# Altium footprint library PcbLibLafe.PcbLib: 294 footprints (part 6 of 19)
Each footprint in its own frame and in the unit in brackets; x right, y up, seen from the top. Pads: shape width x height; smd on the part's side, far side on the other; paste and mask are expansions set on the pad; w line width, h text height; cw(c..) or ccw(c..) is an arc to the next point about the centre after c.
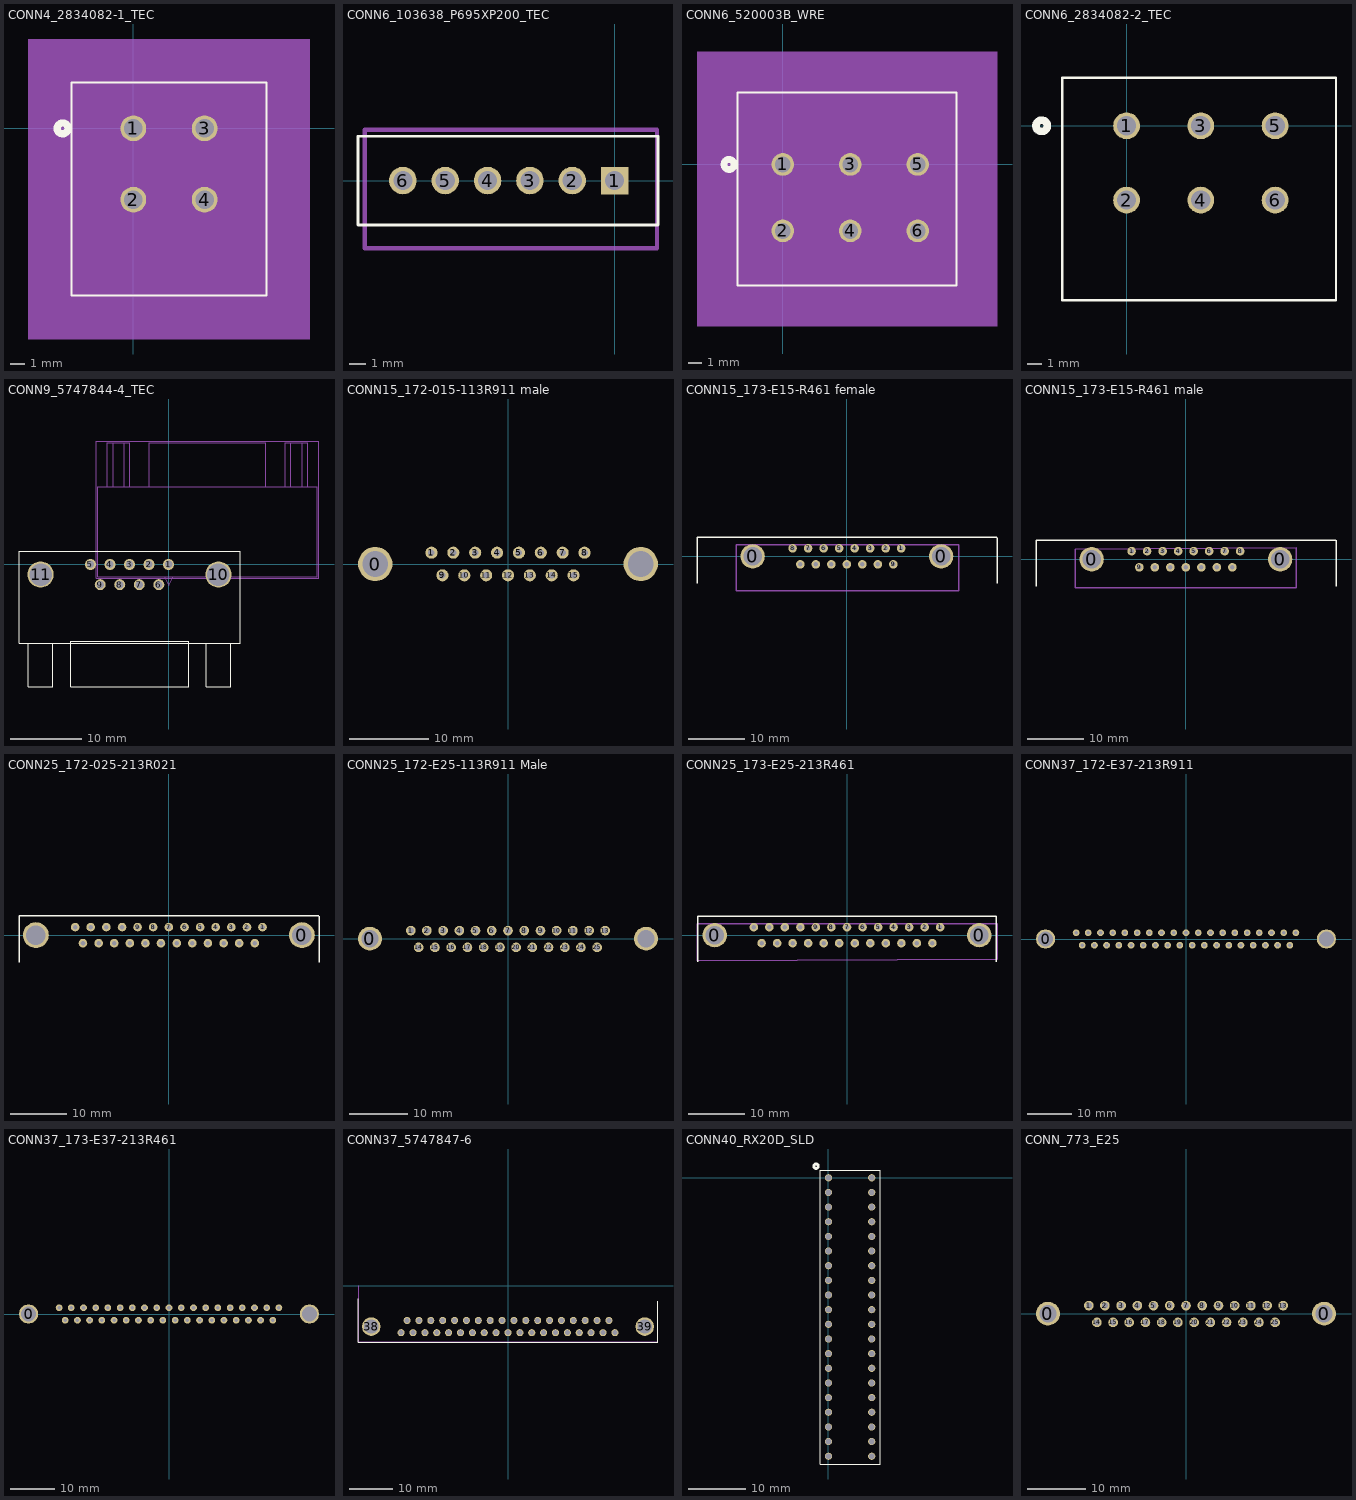
[diagram p5: the footprints below, top view; thin cyan lines are the x and y axes]

## CONN4_2834082-1_TEC [mil]
pads (4):
  round 71 hole 51 mask+0: 1(0,0) 2(0,-196.85) 3(196.85,0) 4(196.85,-196.85)
Top Overlay:
  circle w20: c-195.57,0 r15
  lines w6: -170.57,-461.95 -170.57,127.05 367.43,127.05 367.43,-461.95 -170.57,-461.95
Bottom Overlay:
  circle w20: c-195.57,0 r15
Mechanical 5:
  region: -290.57,247.05 487.43,247.05 487.43,-581.95 -290.57,-581.95
Mechanical 13:
  circle w20: c0,75 r15
  lines w1: -165.57,-456.95 -165.57,122.05 362.43,122.05 362.43,-456.95 -165.57,-456.95
Mechanical 15:
  region: 372.43,132.05 -175.57,132.05 -175.57,-466.95 372.43,-466.95
  lines w6: -175.57,-466.95 372.43,-466.95 372.43,132.05 -175.57,132.05 -175.57,-466.95
3D body "c-2834082-1-a-3d.stp": height 796.26, standoff -157.48, extent -153.94,-440 353.94,117.1
3D body: height 10, standoff 0, extent 0,0 10,10

## CONN6_103638_P695XP200_TEC [mil]
pads (6):
  rect 65x65 hole 45 mask+0: 1(0,0)
  round 65 hole 45 mask+0: 2(-100,0) 3(-200,0) 4(-300,0) 5(-400,0) 6(-500,0)
Top Overlay:
  lines w6: -606,-105 -606,105 102.5,105 102.5,-105 -606,-105
Mechanical 7:
Mechanical 40:
  lines w10: -590,-160 -590,120 100,120 100,-160 -590,-160
3D body: height 10, standoff 0, extent 0,0 10,10
3D body "c-103638-5-s-3d.stp": height 495, standoff -169.96, extent -594.44,-157 100.44,118

## CONN6_520003B_WRE [mil]
pads (6):
  round 67 hole 47 mask+0: 1(0,0) 2(0,-196.85) 3(200,0) 4(200,-196.85) 5(400,0) 6(400,-196.85)
Top Overlay:
  circle w20: c-159.32,0 r15
  lines w6: -134.32,-359.33 -134.32,213.67 515.05,213.67 515.05,-359.33 -134.32,-359.33
Bottom Overlay:
  circle w20: c-159.32,0 r15
Mechanical 5:
  region: -254.32,333.67 635.05,333.67 635.05,-479.33 -254.32,-479.33
Mechanical 13:
  circle w20: c0,75 r15
  lines w1: -129.32,-354.33 -129.32,208.67 510.05,208.67 510.05,-354.33 -129.32,-354.33
Mechanical 15:
  region: 520.05,218.67 -139.32,218.67 -139.32,-364.33 520.05,-364.33
  lines w6: -139.32,-364.33 520.05,-364.33 520.05,218.67 -139.32,218.67 -139.32,-364.33
3D body: height 10, standoff 0, extent 0,0 10,10
3D body "Download_STP_691408520003B_rev1.stp": height 531.5, standoff -168.74, extent -159.06,-351.18 527.56,200

## CONN6_2834082-2_TEC [mil]
pads (6):
  round 71 hole 51 mask+0: 1(0,0) 2(0,-196.85) 3(196.85,0) 4(196.85,-196.85) 5(393.7,0) 6(393.7,-196.85)
Top Overlay:
  circle w20: c-225,0 r15
  lines w6: -170.57,-461.95 -170.57,127.05 555,127.05 555,-461.95 -170.57,-461.95
3D body "2834082-2--3DModel-STEP-1.STEP": height 796.26, standoff -157.48, extent -157.36,-442.58 547.36,114.53
3D body: height 10, standoff 0, extent 0,0 10,10

## CONN9_5747844-4_TEC [mil]
pads (11):
  round 61 hole 41 mask+0: 1(0,0) 2(-108,0) 3(-216,0) 4(-324,0) 5(-432,0) 6(-54,-112) 7(-162,-112) 8(-270,-112) 9(-378,-112)
  round 145 hole 125: 10(276,-56) 11(-708,-56)
Top Overlay:
  lines w6: -775.5,-435 -775.5,-678 -640.5,-678 -640.5,-435 ; 208.5,-435 208.5,-678 343.5,-678 343.5,-435 ; -827.5,-435 -827.5,72 395.5,72 395.5,-435 -827.5,-435 ; -542.5,-678 -542.5,-425 110.5,-425 110.5,-678 -542.5,-678
Mechanical 13:
  lines w1: -338.5,430 -338.5,673 -213.5,673 -213.5,430 ; -307.25,430 -307.25,673 ; -244.75,430 -244.75,673 ; -25,-67 0,-117 25,-67 ; 645.5,430 645.5,673 770.5,673 770.5,430 ; 676.75,430 676.75,673 ; 739.25,430 739.25,673 ; -390.5,-67 822.5,-67 822.5,430 -390.5,430 -390.5,-67 ; -105.5,430 537.5,430 537.5,673 -105.5,673 -105.5,430
Mechanical 15:
  lines w6: -400.5,-77 -400.5,683 832.5,683 832.5,-77 -400.5,-77
3D body "c-5747844-04-o-3d.stp": height 497, standoff -125.4, extent -823,-679.9 397,64

## CONN15_172-015-113R911 male [mil] "15-pin Dsub male straight"
pads (17):
  round 170 hole 128: 0(-656,0)
  round 60 hole 32: 1(-378,56) 2(-270,56) 3(-162,56) 4(-54,56) 5(54,56) 6(162,56) 7(270,56) 8(378,56) 9(-324,-56) 10(-216,-56) 11(-108,-56) 12(0,-56) 13(108,-56) 14(216,-56) 15(324,-56)
  round 170 hole 128 unplated: ""(656,0)
3D body "172-015-112.STEP": height 495.91, standoff -187.59, extent -776.5,-245 766.5,251

## CONN15_173-E15-R461 female [mil] "15-pin Dsub Female right angle"
pads (17):
  round 170 hole 128: 0(-656,0)
  round 170 hole 128 unplated: 0(656,0)
  round 60 hole 32: 1(378,56) 2(270,56) 3(162,56) 4(54,56) 5(-54,56) 6(-162,56) 7(-270,56) 8(-378,56) 9(324,-56) 10(216,-56) 11(108,-56) 12(0,-56) 13(-108,-56) 14(-216,-56) 15(-324,-56)
Top Overlay:
  lines w10: -1043.31,-188 -1043.31,133.86 1043.31,133.86 ; 1045.28,-188 1045.28,131.1
Mechanical 40:
  lines w10: -770,-240 780,-240 780,80 -770,80 -770,-240
3D body "173-E15-213R001.STEP": height 346.06, standoff -268.11, extent -766.65,-602.54 776.66,76.2

## CONN15_173-E15-R461 male [mil] "15-pin Dsub male right angle"
pads (17):
  round 170 hole 128: 0(-656,0)
  round 170 hole 128 unplated: 0(656,0)
  round 60 hole 32: 1(-378,56) 2(-270,56) 3(-162,56) 4(-54,56) 5(54,56) 6(162,56) 7(270,56) 8(378,56) 9(-324,-56) 10(-216,-56) 11(-108,-56) 12(0,-56) 13(108,-56) 14(216,-56) 15(324,-56)
Top Overlay:
  lines w10: -1043.31,-188 -1043.31,133.86 1043.31,133.86 ; 1045.28,-188 1045.28,131.1
Mechanical 40:
  lines w10: -770,-200 770,-200 770,80 -770,70 -770,-200
3D body "173-E15-113R001.step.STEP": height 396.06, standoff -214.17, extent -771.65,-612.32 771.66,72.32

## CONN25_172-025-213R021 [mil] "25-pin Dsub Female straight"
pads (27):
  round 180 hole 135 unplated: 0(926,0)
  round 60 hole 32: 1(652,56) 2(544,56) 3(435,56) 4(326,56) 5(218,56) 6(109,56) 7(0,56) 8(-109,56) 9(-218,56) 10(-326,56) 11(-435,56) 12(-544,56) 13(-652,56) 14(598,-56) 15(489,-56) 16(381,-56) 17(272,-56) 18(163,-56) 19(55,-56) 20(-55,-56) 21(-163,-56) 22(-272,-56) 23(-381,-56) 24(-489,-56) 25(-598,-56)
  round 180 hole 135: ""(-926,0)
Top Overlay:
  lines w10: -1043.31,-188 -1043.31,133.86 1043.31,133.86 ; 1045.28,-188 1045.28,131.1
3D body "172-E25-213.STEP": height 497, standoff -188.5, extent -1042,-245 1045,251

## CONN25_172-E25-113R911 Male [mil] "25 pin maie straight"
pads (27):
  round 160 hole 115: 0(-926,0) ""(926,0)
  round 65 hole 40: 1(-652,54) 2(-544,54) 3(-435,54) 4(-326,54) 5(-218,54) 6(-109,54) 7(0,54) 8(109,54) 9(218,54) 10(326,54) 11(435,54) 12(544,54) 13(652,54) 14(-599,-58) 15(-490,-58) 16(-381,-58) 17(-272,-58) 18(-163,-58) 19(-54,-58) 20(55,-58) 21(163,-58) 22(272,-58) 23(381,-58) 24(489,-58) 25(598,-58)
3D body "172-025-112.STEP": height 490, standoff -193.5, extent -1048.5,-245 1038.5,251

## CONN25_173-E25-213R461 [mil] "25-pin Dsub Female right angle"
pads (27):
  round 170 hole 128: 0(-926,0)
  round 170 hole 128 unplated: 0(926,0)
  round 60 hole 32: 1(652,56) 2(544,56) 3(435,56) 4(326,56) 5(218,56) 6(109,56) 7(0,56) 8(-109,56) 9(-218,56) 10(-326,56) 11(-435,56) 12(-544,56) 13(-652,56) 14(598,-56) 15(489,-56) 16(381,-56) 17(272,-56) 18(163,-56) 19(55,-56) 20(-55,-56) 21(-163,-56) 22(-272,-56) 23(-381,-56) 24(-489,-56) 25(-598,-56)
Top Overlay:
  lines w10: -1043.31,-188 -1043.31,133.86 1043.31,133.86 ; 1045.28,-188 1045.28,131.1
Mechanical 40:
  lines w10: -1050,-180 1050,-170 1050,80 -1050,80 -1050,-180
3D body "173-E25-213R001.STEP": height 446.06, standoff -168.11, extent -1044.58,-607.37 1044,71.37

## CONN37_172-E37-213R911 [mil] "Female 37pin dsub"
pads (39):
  round 170 hole 130: 0(-1250,0) ""(1250,0)
  round 60 hole 32 mask+0: 1(978,56) 2(870,56) 3(761,56) 4(652,56) 5(544,56) 6(435,56) 7(326,56) 8(218,56) 9(109,56) 10(0,56) 11(-109,56) 12(-218,56) 13(-326,56) 14(-435,56) 15(-544,56) 16(-652,56) 17(-761,56) 18(-871,56) 19(-978,56) 20(924,-56) 21(815,-56) 22(707,-56) 23(598,-56) 24(489,-56) 25(381,-56) 26(272,-56) 27(163,-56) 28(55,-56) 29(-55,-56) 30(-163,-56) 31(-272,-56) 32(-381,-56) 33(-489,-56) 34(-598,-56) 35(-707,-56) 36(-815,-56) 37(-924,-56)
3D body "172-E37-213.STEP": height 478.22, standoff -207.28, extent -1359,-219 1369,277

## CONN37_173-E37-213R461 [mil] "Female 37pin dsub"
pads (39):
  round 170 hole 130: 0(-1250,0) ""(1250,0)
  round 60 hole 32: 1(978,56) 2(870,56) 3(761,56) 4(652,56) 5(544,56) 6(435,56) 7(326,56) 8(218,56) 9(109,56) 10(0,56) 11(-109,56) 12(-218,56) 13(-326,56) 14(-435,56) 15(-544,56) 16(-652,56) 17(-761,56) 18(-871,56) 19(-978,56) 20(924,-56) 21(815,-56) 22(707,-56) 23(598,-56) 24(489,-56) 25(381,-56) 26(272,-56) 27(163,-56) 28(55,-56) 29(-55,-56) 30(-163,-56) 31(-272,-56) 32(-381,-56) 33(-489,-56) 34(-598,-56) 35(-707,-56) 36(-815,-56) 37(-924,-56)
Mechanical 1:
  text "Consult datasheet for placement" at -816,-30.01 h60
3D body "174E-037-213.STEP": height 446, standoff -209.5, extent -1367,-698 1361,73.96

## CONN37_5747847-6 [mil] "male 37pin dsub"
pads (39):
  round 65 hole 45 mask+0: 1(-981,-430) 2(-872,-430) 3(-763,-430) 4(-654,-430) 5(-545,-430) 6(-436,-430) 7(-327,-430) 8(-218,-430) 9(-109,-430) 10(0,-430) 11(109,-430) 12(218,-430) 13(327,-430) 14(436,-430) 15(545,-430) 16(654,-430) 17(763,-430) 18(872,-430) 19(981,-430) 20(-926.5,-318) 21(-817.5,-318) 22(-708.5,-318) 23(-599.5,-318) 24(-490.5,-318) 25(-381.5,-318) 26(-272.5,-318) 27(-163.5,-318) 28(-54.5,-318) 29(54.5,-318) 30(163.5,-318) 31(272.5,-318) 32(381.5,-318) 33(490.5,-318) 34(599.5,-318) 35(708.5,-318) 36(817.5,-318) 37(926.5,-318)
  round 170 hole 130: 38(-1255,-374)
  round 170 / inner round 130 / far side round 130 hole 130: 39(1255,-374)
Top Overlay:
  lines w6: -1377,-118 -1377,-517 1377,-517 1377,-141
Mechanical 13:
  lines w1: -1372,0 -1372,-512 1372,-512
3D body: height 10, standoff 0, extent 0,0 10,10
3D body "CONN_5747847-6.step": height 509.02, standoff -125, extent -1362.01,-520 1382.01,235

## CONN40_RX20D_SLD [mil]
pads (40):
  round 49 hole 39 mask+0: 1(0,0) 2(0,-100) 3(0,-200) 4(0,-300) 5(0,-400) 6(0,-500) 7(0,-600) 8(0,-700) 9(0,-800) 10(0,-900) 11(0,-1000) 12(0,-1100) 13(0,-1200) 14(0,-1300) 15(0,-1400) 16(0,-1500) 17(0,-1600) 18(0,-1700) 19(0,-1800) 20(0,-1900) 21(295.28,-1900) 22(295.28,-1800) 23(295.28,-1700) 24(295.28,-1600) 25(295.28,-1500) 26(295.28,-1400) 27(295.28,-1300) 28(295.28,-1200) 29(295.28,-1100) 30(295.28,-1000) 31(295.28,-900) 32(295.28,-800) 33(295.28,-700) 34(295.28,-600) 35(295.28,-500) 36(295.28,-400) 37(295.28,-300) 38(295.28,-200) 39(295.28,-100) 40(295.28,0)
Top Overlay:
  circle w20: c-84.36,79 r15
  lines w6: -57.36,-1953 -57.36,53 352.64,53 352.64,-1953 -57.36,-1953
Bottom Overlay:
  circle w20: c-84.36,79 r15
3D body: height 10, standoff 0, extent 0,0 10,10

## CONN_773_E25 [mil] "25 pin maie right angle"
pads (27):
  round 160 hole 115: 0(-926,0) 0(926,0)
  round 65 hole 40: 1(-652,54) 2(-544,54) 3(-435,54) 4(-326,54) 5(-218,54) 6(-109,54) 7(0,54) 8(109,54) 9(218,54) 10(326,54) 11(435,54) 12(544,54) 13(652,54) 14(-598,-58) 15(-489,-58) 16(-381,-58) 17(-272,-58) 18(-163,-58) 19(-55,-58) 20(55,-58) 21(163,-58) 22(272,-58) 23(381,-58) 24(489,-58) 25(598,-58)
3D body "773-E25-113.STEP": height 496, standoff -124.5, extent -1043,-611.25 1044,67.25